# Altium schematic symbol library Schlib.SchLib: 725 symbols (part 1 of 6)
Pins are listed as number, name and electrical type; pins without a type are passive.

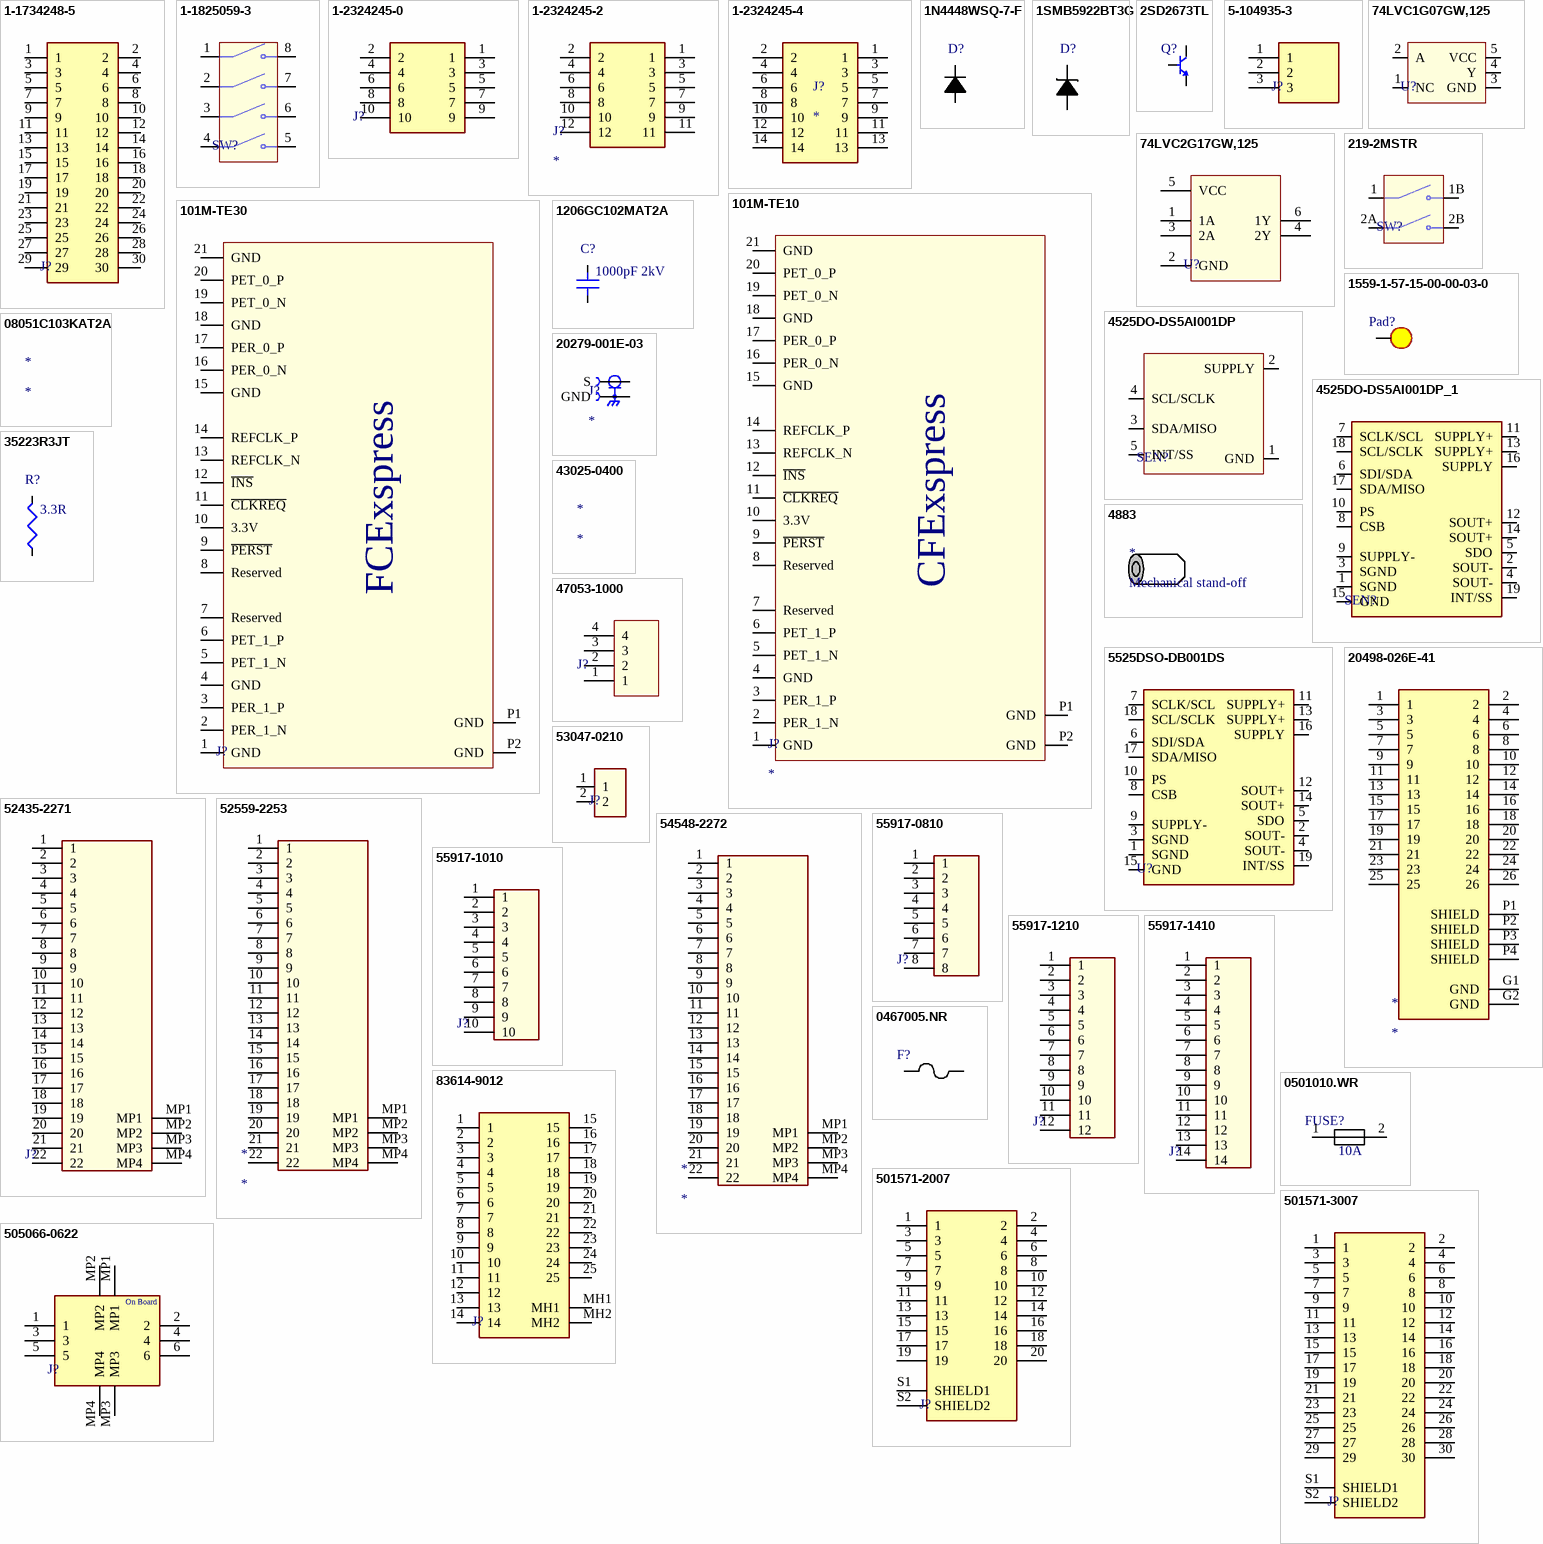
[diagram p0: symbols 1-1734248-5 to 505066-0622]

## 1-1734248-5
designator J?  (value not drawn)
FPC CONNECTOR, RECEPTACLE 15POS 1MMPITCH; Series:FPC; Gender:Receptacle; Pitch S; MP: 1-1734248-5; MF: TE Connectivity; EU_RoHS_Compliance: Compliant; TE_purchase_URL: https://www.te.com/usa-en/product-1-1734248-5.html?te_bu=Cor&te_type=disp&te_campaign=seda_glo_cor-seda-global-disp-prtnr-fy19-seda-model-bom-cta_sma-317_1&elqCampaignId=32493; SnapEDA_Link: https://www.snapeda.com/parts/1-1734248-5/TE%20Connectivity%20AMP%20Connectors/view-part/822357/?ref=snap; Package: None; Digi-Key_Purchase_URL: https://www.digikey.com/product-detail/en/te-connectivity-amp-connectors/1-1734248-5/A101418CT-ND/2567554?utm_source=snapeda&utm_medium=aggregator&utm_campaign=symbol; Digi-Key_Part_Number: A101418CT-ND; Value: *
footprint 1-1734248-5
pins: 1, 2, 3, 4, 5, 6, 7, 8, 9, 10, 11, 12, 13, 14, 15, 16, 17, 18, 19, 20, 21, 22, 23, 24, 25, 26, 27, 28, 29, 30

## 1-1825059-3
designator SW?  (value not drawn)
Switch DIP OFF ON SPST 4 Flush Slide 0.1A 24VDC Gull Wing 2.54mm SMD Tube; Manufacturer: TE Connectivity; Manufacturer Part Number: 1-1825059-3; Actuator Material: Polyamide; Body Material: Polyphenylene; Mechanical Life: 1000Cycles; Max Voltage Rating (DC): 24V; Number of Positions: 4; Contact Resistance: 50mR; Voltage Rating (DC): 5V; Max Current Rating: 100mA; Contact Current Rating: 1A; Sealable: No (Without); Actuator Type: Slide (Standard); Pitch: 0.1inch; Actuator Length: 0mm; Washable: Yes; Supplier: Future Electronics; Supplier Part Number: 2164646; RoHS: Yes; Category: DIP Switches; Stock: 11020; Pricing: 1=0.62, 50=0.6, 200=0.57, 500=0.555, 2000=0.51 (USD); Mounting Technology: Surface Mount; Contact Material: Copper Alloy; Contact Plating: Gold; Housing Color: Black; Housing Material: Polyphenylene; Min Operating Temperature: -30°C; Max Operating Temperature: 85°C; Throw Configuration: SPST; Termination: Gull Wing; Packaging: Rail/Tube; Package Quantity: 35; Electrical Life: 1000Cycles; Number of Circuits: 4; Orientation: Straight; Type: Switch; Series: ADF; Current Rating: 100mA; Length: 12.14mm; Height: 0.138inch; Terminal Pitch: 2.54mm; Depth: 9.3mm; Radiation Hardening: No; ELV: Compliant; Flammability Rating: UL94 V-0; RoHS Compliant: Yes; Reach SVHC Compliant: Unknown; Lead Free: 5697LeadFree
footprint 1-1825059-3
pins: 1, 2, 3, 4, 5, 6, 7, 8

## 1-2324245-0
designator J?  (value not drawn)
Board Connector, 10 Contact(s), 2 Row(s), Male, Straight, Solder Terminal, Natural Insulator; Manufacturer: TE Connectivity; Manufacturer Part Number: 1-2324245-0; Manufacturer Lifecycle Status: ACTIVE; Connector System: Wire-to-Board; Contact Current Rating: 4.2A; Contact Style: Pin; Dielectric Material: Polyamide; Mating Retention: Without; Number of Contacts: 10; Number of Ports: 1; Operating Supply Voltage: 250V; PCB Mount Alignment: With; Plating: Tin; Plating Thickness: 1.999996µm; Sealable: No; Supplier: DigiKey; Supplier Part Number: 17-1-2324245-0-ND; RoHS: Compliant; Category: Card Edge Connectors; Stock: 4822; Pricing: 1=1.09, 10=0.927, 100=0.7879, 500=0.70322, 1440=0.65263, 5760=0.59184, 10080=0.56895 (USD); China RoHS: Compliant; Contact Gender: Male; Contact Material: Brass; Contact Plating: Tin; Current Rating: 4.2A; Housing Color: Natural; Housing Material: Nylon; Length: 15.39mm; Lifecycle Status: Production; Max Operating Temperature: 105°C; Min Operating Temperature: -55°C; Pins: 10; Number of Positions: 10; Number of Rows: 2; Orientation: Vertical; Packaging: Box; PCB Mount Retention: With; REACH SVHC: Yes; Shielding: No; Terminal Pitch: 2.5mm; Width: 10.16mm; ComponentLink1URL: https://datasheet.octopart.com:443/1-2324245-0-TE-Connectivity-datasheet-179910410.pdf?src-supplier=IHS; ComponentLink1Description: https://datasheet.octopart.com:443/1-2324245-0-TE-Connectivity-datasheet-179910410.pdf?src-supplier=IHS; ComponentLink2URL: https://datasheet.octopart.com:443/1-2324245-0-TE-Connectivity-datasheet-179910411.pdf?src-supplier=IHS; ComponentLink2Description: https://datasheet.octopart.com:443/1-2324245-0-TE-Connectivity-datasheet-179910411.pdf?src-supplier=IHS; ComponentLink3URL: https://datasheet.octopart.com:443/1-2324245-0-TE-Connectivity-datasheet-136662082.pdf?src-supplier=Electro+Sonic; ComponentLink3Description: https://datasheet.octopart.com:443/1-2324245-0-TE-Connectivity-datasheet-136662082.pdf?src-supplier=Electro+Sonic; ComponentLink4URL: https://sigma.octopart.com:443/136536141/technical_drawing/TE-Connectivity-1-2324245-0.pdf?src-supplier=ShanghaiCT; ComponentLink4Description: https://sigma.octopart.com:443/136536141/technical_drawing/TE-Connectivity-1-2324245-0.pdf?src-supplier=ShanghaiCT
footprint 1-2324245-0
pins: 1, 2, 3, 4, 5, 6, 7, 8, 9, 10

## 1-2324245-2
designator J?
Board Connector, 12 Contact(s), 2 Row(s), Male, Straight, Solder Terminal, Natural Insulator; Manufacturer: TE Connectivity / AMP; Manufacturer Part Number: 1-2324245-2; Connector System: Wire-to-Board; Contact Current Rating: 4.2A; Contact Style: Pin; Dielectric Material: Polyamide; Mating Retention: Without; Number of Contacts: 12; Number of Ports: 1; Operating Supply Voltage: 250V; PCB Mount Alignment: With; Plating: Tin; Plating Thickness: 1.999996µm; Sealable: No; Supplier: DigiKey; Supplier Part Number: 17-1-2324245-2-ND; RoHS: Compliant; Category: Card Edge Connectors; Stock: 6151; Pricing: 1=1.27, 10=1.075, 100=0.9136, 500=0.81546, 1440=0.75681, 5760=0.68632, 10080=0.65978 (USD); China RoHS: Compliant; Contact Gender: Male; Contact Material: Brass; Contact Plating: Tin; Current Rating: 4.2A; Housing Color: Natural; Housing Material: Nylon; Length: 17.8816mm; Lifecycle Status: Production; Max Operating Temperature: 105°C; Min Operating Temperature: -55°C; Pins: 12; Number of Positions: 12; Number of Rows: 2; Orientation: Vertical; Packaging: Box; PCB Mount Retention: With; REACH SVHC: Yes; Shielding: No; Terminal Pitch: 2.5mm; Width: 10.16mm; ComponentLink1URL: https://datasheet.octopart.com:443/1-2324245-2-TE-Connectivity-datasheet-179910413.pdf?src-supplier=IHS; ComponentLink1Description: https://datasheet.octopart.com:443/1-2324245-2-TE-Connectivity-datasheet-179910413.pdf?src-supplier=IHS; ComponentLink2URL: https://datasheet.octopart.com:443/1-2324245-2-TE-Connectivity-datasheet-179910412.pdf?src-supplier=IHS; ComponentLink2Description: https://datasheet.octopart.com:443/1-2324245-2-TE-Connectivity-datasheet-179910412.pdf?src-supplier=IHS; ComponentLink3URL: https://datasheet.octopart.com:443/1-2324245-2-TE-Connectivity---AMP-datasheet-136662082.pdf?src-supplier=Sager+Electronics; ComponentLink3Description: https://datasheet.octopart.com:443/1-2324245-2-TE-Connectivity---AMP-datasheet-136662082.pdf?src-supplier=Sager+Electronics; ComponentLink4URL: https://sigma.octopart.com:443/136536141/technical_drawing/TE-Connectivity-1-2324245-2.pdf?src-supplier=ShanghaiCT; ComponentLink4Description: https://sigma.octopart.com:443/136536141/technical_drawing/TE-Connectivity-1-2324245-2.pdf?src-supplier=ShanghaiCT
footprint 1-2324245-2
pins: 1, 2, 3, 4, 5, 6, 7, 8, 9, 10, 11, 12

## 1-2324245-4
designator J?
Manufacturer: TE Connectivity AMP; Manufacturer Part Number: 1-2324245-4; Supplier 1: Mouser; RoHS: No; Pricing 1: 1=1.16, 10=0.984, 50=0.924, 100=0.884, 1000=0.723, 10000=0.617 (USD); Supplier Part Number 1: 571-1-2324245-4
footprint 1-2324245-4
pins: 1, 2, 3, 4, 5, 6, 7, 8, 9, 10, 11, 12, 13, 14

## 1N4448WSQ-7-F
designator D?  (value not drawn)
Rectifier Diode Small Signal Switching 75V 0.5A 4ns Automotive 2-Pin SOD-323 T/R; Manufacturer: Diodes; Manufacturer Part Number: 1N4448WSQ-7-F; Average Rectified Current: 250mA; Supplier: Digi-Key; Supplier Part Number: 1N4448WSQ-7-FDICT-ND; RoHS: Yes; Category: Rectifier Diodes; Stock: 112432; Pricing: 1=0.28000, 10=0.23300, 100=0.12330, 500=0.08112, 1000=0.05516 (USD); Mounting Technology: Surface Mount; Packaging: Tape and Reel; Reverse Recovery Time: 4ns; Max Reverse Voltage (DC): 75V; RoHS Compliant: Yes; ComponentLink1URL: http://www.mouser.com/ds/2/115/1N4448WSF-606710.pdf?src-supplier=Mouser; ComponentLink1Description: http://www.mouser.com/ds/2/115/1N4448WSF-606710.pdf?src-supplier=Mouser; ComponentLink2URL: https://www.diodes.com/assets/Datasheets/ds30096.pdf?src-supplier=Digi-Key; ComponentLink2Description: https://www.diodes.com/assets/Datasheets/ds30096.pdf?src-supplier=Digi-Key
footprint SC-76, SOD-323
pins: 1 C, 2 A

## 1SMB5922BT3G
designator D?  (value not drawn)
Zener Diode Single 7.5V 5% 3Ohm 3000mW Automotive 2-Pin SMB T/R / DIODE ZENER 7.5V 3W SMB; Manufacturer: onsemi; Manufacturer Part Number: 1SMB5922BT3G; Manufacturer Lifecycle Status: ACTIVE; Breakdown Voltage: 7.88V; Forward Voltage: 1.5V; Impedance: 3Ω; Material: Plastic; Max Power Dissipation: 550mW; Max Reverse Leakage Current: 5µA; Number of Elements: 1; Polarity: Unidirectional; Test Current: 50mA; Supplier: Future Electronics; Supplier Part Number: 2745859; RoHS: Compliant; Category: Zener Diodes; Stock: 67500; Pricing: 2500=0.122, 5000=0.12, 7500=0.119, 12500=0.117 (USD); Case/Package: SMB; China RoHS: Non-Compliant; Element Configuration: Single; Halogen Free: Halogen Free; Height: 2.28mm; Lead Free: Lead Free; Length: 4.6mm; Lifecycle Status: Production; Max Operating Temperature: 150°C; Min Operating Temperature: -65°C; Mounting Technology: Surface Mount; Pins: 2; Number of Terminals: 2; Packaging: Tape and Reel; Peak Reverse Current: 5µA; Power Dissipation: 550mW; Power Rating: 3W; Radiation Hardening: No; REACH SVHC: No; Reference Voltage: 7.5V; Schedule B: 8541100050; Tolerance: 5%; Voltage Rating (DC): 7.5V; Voltage Tolerance: 5%; Width: 3.95mm; Working Voltage: 7.5V; Zener Current: 50mA; Zener Voltage: 7.5V; ComponentLink1URL: https://datasheet.octopart.com:443/1SMB5922BT3G-ON-Semiconductor-datasheet-10678159.pdf?src-supplier=Newark; ComponentLink1Description: https://datasheet.octopart.com:443/1SMB5922BT3G-ON-Semiconductor-datasheet-10678159.pdf?src-supplier=Newark; ComponentLink2URL: https://datasheet.octopart.com:443/1SMB5922BT3G-ON-Semiconductor-datasheet-153452.pdf?src-supplier=Newark; ComponentLink2Description: https://datasheet.octopart.com:443/1SMB5922BT3G-ON-Semiconductor-datasheet-153452.pdf?src-supplier=Newark; ComponentLink3URL: https://datasheet.octopart.com:443/1SMB5922BT3G-ON-Semiconductor-datasheet-10412137.pdf?src-supplier=Newark; ComponentLink3Description: https://datasheet.octopart.com:443/1SMB5922BT3G-ON-Semiconductor-datasheet-10412137.pdf?src-supplier=Newark; ComponentLink4URL: https://datasheet.octopart.com:443/1SMB5922BT3G-ON-Semiconductor-datasheet-67293418.pdf?src-supplier=Newark; ComponentLink4Description: https://datasheet.octopart.com:443/1SMB5922BT3G-ON-Semiconductor-datasheet-67293418.pdf?src-supplier=Newark; ComponentLink5URL: https://datasheet.octopart.com:443/1SMB5922BT3G-onsemi-datasheet-180957219.pdf?src-supplier=IHS; ComponentLink5Description: https://datasheet.octopart.com:443/1SMB5922BT3G-onsemi-datasheet-180957219.pdf?src-supplier=IHS; ComponentLink6URL: https://datasheet.octopart.com:443/1SMB5922BT3G-onsemi-datasheet-188912624.pdf?src-supplier=TME; ComponentLink6Description: https://datasheet.octopart.com:443/1SMB5922BT3G-onsemi-datasheet-188912624.pdf?src-supplier=TME; ComponentLink7URL: https://datasheet.octopart.com:443/1SMB5922BT3G-onsemi-datasheet-189864032.pdf?src-supplier=Master+Electronics; ComponentLink7Description: https://datasheet.octopart.com:443/1SMB5922BT3G-onsemi-datasheet-189864032.pdf?src-supplier=Master+Electronics; ComponentLink8URL: https://datasheet.octopart.com:443/1SMB5922BT3G-ON-Semiconductor-datasheet-14050955.pdf?src-supplier=iiiC; ComponentLink8Description: https://datasheet.octopart.com:443/1SMB5922BT3G-ON-Semiconductor-datasheet-14050955.pdf?src-supplier=iiiC; ComponentLink9URL: https://datasheet.octopart.com:443/1SMB5922BT3G-ON-Semiconductor-datasheet-9561972.pdf?src-supplier=RS+(Formerly+Allied+Electronics); ComponentLink9Description: https://datasheet.octopart.com:443/1SMB5922BT3G-ON-Semiconductor-datasheet-9561972.pdf?src-supplier=RS+(Formerly+Allied+Electronics); ComponentLink10URL: https://datasheet.octopart.com:443/1SMB5922BT3G-ON-Semiconductor-datasheet-7627526.pdf?src-supplier=Farnell; ComponentLink10Description: https://datasheet.octopart.com:443/1SMB5922BT3G-ON-Semiconductor-datasheet-7627526.pdf?src-supplier=Farnell; ComponentLink11URL: http://sigma.octopart.com:80/15540786/rohs_certificate/ON-Semiconductor-1SMB5922BT3G.pdf?src-supplier=Compliance+Statements; ComponentLink11Description: http://sigma.octopart.com:80/15540786/rohs_certificate/ON-Semiconductor-1SMB5922BT3G.pdf?src-supplier=Compliance+Statements; ComponentLink12URL: http://sigma.octopart.com:80/15673265/materials_sheet/ON-Semiconductor-1SMB5922BT3G.csv?src-supplier=Compliance+Statements; ComponentLink12Description: http://sigma.octopart.com:80/15673265/materials_sheet/ON-Semiconductor-1SMB5922BT3G.csv?src-supplier=Compliance+Statements; ComponentLink13URL: http://sigma.octopart.com:80/150599696/rohs_statement/ON-Semiconductor-1SMB5922BT3G.pdf?src-supplier=Compliance+Statements; ComponentLink13Description: http://sigma.octopart.com:80/150599696/rohs_statement/ON-Semiconductor-1SMB5922BT3G.pdf?src-supplier=Compliance+Statements; ComponentLink14URL: http://sigma.octopart.com:80/reach_statement/ON-Semiconductor-company-79.pdf?src-supplier=Compliance+Statements; ComponentLink14Description: http://sigma.octopart.com:80/reach_statement/ON-Semiconductor-company-79.pdf?src-supplier=Compliance+Statements; ComponentLink15URL: https://octopart.com:443/opatz8j6/c1?t=-7Rg5-dSOU17S9jwLgJaavQGNUK9I1EhJcmL9O0uj0MAmvVYjunI46o06CYUqwLsnTuZJspTSg8-XwmEUtJEwnxSUGjx9aoqj4zPIYIcezFGTC7sXXgO-3Xuah-Wupz6Xwk_Pk9Iz_qMgvxKBFd9CBDUs-wWmsDvgPLrEWXJydIv3Ndk7mJtZGppQRaSRE83wVcjcEf3Mtwz2hYf1pKoff-5cvyHiRKQZbTd2pGjMVKMsmql2P0_vAYkmP_Enr17p01wrcW36guBQHgV71z0O3t4ZwkjxooQqRImpCkT62eGixJE513f7NLjaDwmb4xkSeGRzr_CYUJT6e777a2dUGKES0C5LFNNnPTvFrWs&src-supplier=Compliance+Statements; ComponentLink15Description: https://octopart.com:443/opatz8j6/c1?t=-7Rg5-dSOU17S9jwLgJaavQGNUK9I1EhJcmL9O0uj0MAmvVYjunI46o06CYUqwLsnTuZJspTSg8-XwmEUtJEwnxSUGjx9aoqj4zPIYIcezFGTC7sXXgO-3Xuah-Wupz6Xwk_Pk9Iz_qMgvxKBFd9CBDUs-wWmsDvgPLrEWXJydIv3Ndk7mJtZGppQRaSRE83wVcjcEf3Mtwz2hYf1pKoff-5cvyHiRKQZbTd2pGjMVKMsmql2P0_vAYkmP_Enr17p01wrcW36guBQHgV71z0O3t4ZwkjxooQqRImpCkT62eGixJE513f7NLjaDwmb4xkSeGRzr_CYUJT6e777a2dUGKES0C5LFNNnPTvFrWs&src-supplier=Compliance+Statements; ComponentLink16URL: https://octopart.com:443/opatz8j6/c1?t=NgEzYUtCDJ1w5-5WDxpkIolHOKxYmBgDgk-9cXA7jIA6s3Xk8fSO9zTHMsU2ucfknkyd0g8yK1u_XLrEUQPKRB3unLoM0tUfBPnKIOq9VLpIKVf_U5C7HQk7b9f9pw0ozZqgNezt-ul_dFuacCARCxN895LxkLa4wbit1BVLXj1fhcqP5HuG5PJsD6MHDp_ris7Bp_ACvKCavLZ8j5PJTVazboxl6G4nD9_Li_rOJfneY0TTDQZa7OdjLNlnkuML4yjssLJrVdZ06UZcmqArRYxRs9qObHVQGKUZC99UGEe7SPRA8zOzH6KruEqYCxczlBDkjn6t_4W0hA_6qC9jEROtj5GEUkvm_LByjYk&src-supplier=Compliance+Statements; ComponentLink16Description: https://octopart.com:443/opatz8j6/c1?t=NgEzYUtCDJ1w5-5WDxpkIolHOKxYmBgDgk-9cXA7jIA6s3Xk8fSO9zTHMsU2ucfknkyd0g8yK1u_XLrEUQPKRB3unLoM0tUfBPnKIOq9VLpIKVf_U5C7HQk7b9f9pw0ozZqgNezt-ul_dFuacCARCxN895LxkLa4wbit1BVLXj1fhcqP5HuG5PJsD6MHDp_ris7Bp_ACvKCavLZ8j5PJTVazboxl6G4nD9_Li_rOJfneY0TTDQZa7OdjLNlnkuML4yjssLJrVdZ06UZcmqArRYxRs9qObHVQGKUZC99UGEe7SPRA8zOzH6KruEqYCxczlBDkjn6t_4W0hA_6qC9jEROtj5GEUkvm_LByjYk&src-supplier=Compliance+Statements
footprint DO-214AA_SMB
pins: 1 C, 2 A

## 2SD2673TL
designator Q?  (value not drawn)
Trans Gp Bjt NPN 30V 3A 1000MW 3-PIN Tsmt T/r; Manufacturer: Rohm; Manufacturer Part Number: 2SD2673TL; Max Power Dissipation: 1W; hFE Min: 270; Frequency: 200MHz; Emitter Base Voltage (VEBO): 6V; Collector Emitter Saturation Voltage: 120mV; Number of Elements: 1; Element Configuration: Single; Collector-emitter Voltage-Max: 250mV; Supplier: Digi-Key; Supplier Part Number: 2SD2673TLCT-ND; RoHS: Yes; Category: BJTs; Stock: 1439; Pricing: 1=0.72000, 10=0.63300, 100=0.48540, 500=0.38372, 1000=0.30698 (USD); Mounting Technology: Surface Mount; Case/Package: SOT-346T; Pins: 3; Contact Plating: Copper,Tin,Silver; Min Operating Temperature: -55°C; Max Operating Temperature: 150°C; Packaging: Tape and Reel; Package Quantity: 1; Collector Emitter Voltage (VCEO): 30V; Max Collector Current: 3A; Transition Frequency: 200MHz; Collector Emitter Breakdown Voltage: 30V; Max Breakdown Voltage: 30V; Polarity: NPN; Collector Base Voltage (VCBO): 30V; Power Dissipation: 1W; Gain Bandwidth Product: 200MHz; Voltage Rating (DC): 30V; Current Rating: 3A; Series: -; Radiation Hardening: No; Lead Free: Lead Free; RoHS Compliant: Yes; ComponentLink1URL: https://datasheet.ciiva.com/11203/2sd2673-11203489.pdf?src-supplier=Avnet; ComponentLink1Description: https://datasheet.ciiva.com/11203/2sd2673-11203489.pdf?src-supplier=Avnet; ComponentLink2URL: https://datasheet.ciiva.com/26878/getdatasheetpartid-457694-26878623.pdf?src-supplier=Verical; ComponentLink2Description: https://datasheet.ciiva.com/26878/getdatasheetpartid-457694-26878623.pdf?src-supplier=Verical; ComponentLink3URL: https://datasheet.ciiva.com/975/2sd2673-975303.pdf?src-supplier=Digi-Key; ComponentLink3Description: https://datasheet.ciiva.com/975/2sd2673-975303.pdf?src-supplier=Digi-Key; ComponentLink4URL: https://datasheet.ciiva.com/16289/2sd2673-209105-16289342.pdf?src-supplier=Mouser; ComponentLink4Description: https://datasheet.ciiva.com/16289/2sd2673-209105-16289342.pdf?src-supplier=Mouser; ComponentLink5URL: https://datasheet.ciiva.com/975/2sd2673-975304.pdf?src-supplier=Digi-Key; ComponentLink5Description: https://datasheet.ciiva.com/975/2sd2673-975304.pdf?src-supplier=Digi-Key; ComponentLink6URL: https://datasheet.ciiva.com/975/2sd2673-975305.pdf?src-supplier=Digi-Key; ComponentLink6Description: https://datasheet.ciiva.com/975/2sd2673-975305.pdf?src-supplier=Digi-Key
footprint SOT-346
pins: 1 B, 2 E, 3 C

## 5-104935-3
designator J?  (value not drawn)
Connector, Header, 3Pos, 1Rows, 2.54Mm Rohs Compliant: Yes |Amp Te Connectivity 5-104935-3; Manufacturer Lifecycle Status: ACTIVE; Approvals: CSA; Connector Type: Header, Pin, Plug; Contact Current Rating: 3A; Contact Resistance: 15mΩ; Contact Style: Pin; Dielectric Material: Polyethylene; Gender: Male; Insulation Resistance: 5GΩ; Mating Post Length: 5.842mm; Mating Retention: With; Max Voltage Rating (AC): 30V; Number of Contacts: 3; Number of Ports: 1; Operating Force: 2.502N; PCB Mount Alignment: Without; PCB Mounting Orientation: Right Angle; PCB Thickness: 1.5748mm; Plating: Gold; Plating Thickness: 762nm; Shielding: No; Tail Length: 3.3mm; Supplier: Farnell; Supplier Part Number: 3398527; Manufacturer: TE Connectivity; Manufacturer Part Number: 5-104935-3; RoHS: Compliant; Category: Headers and Wire Housings; Stock: 3660; Pricing: 1=1.28, 10=1.03, 100=0.772, 500=0.716, 1000=0.683, 2500=0.669 (EUR); China RoHS: Compliant; Color: Black; Contact Finish Thickness - Mating: 762nm; Contact Gender: Male; Contact Material: Brass; Contact Mating Length: 5.842mm; Contact Plating: Gold, Tin; Contact Shape: Square; Current Rating: 3A; Depth: 13.59mm; ELV: Compliant; Flammability Rating: UL94 V-0; Height: 6.98mm; Housing Color: Black; Housing Material: Thermoplastic; Lead Free: Lead Free; Length: 10.16mm; Lifecycle Status: Production; Max Operating Temperature: 105°C; Min Operating Temperature: -65°C; Mounting Technology: Through Hole; Pins: 3; Number of Positions: 3; Number of Rows: 1; Orientation: Right Angle; PCB Mount Retention: Without; Pitch: 2.54mm; Radiation Hardening: No; REACH SVHC: Yes; Row Spacing: 2.54mm; Terminal Pitch: 2.54mm; Termination: Crimp; ComponentLink1URL: https://datasheet.octopart.com:443/5-104935-3-TE-Connectivity-datasheet-180094949.pdf?src-supplier=IHS; ComponentLink1Description: https://datasheet.octopart.com:443/5-104935-3-TE-Connectivity-datasheet-180094949.pdf?src-supplier=IHS; ComponentLink2URL: https://datasheet.octopart.com:443/5-104935-3-TE-Connectivity-datasheet-147328941.pdf?src-supplier=Upverter; ComponentLink2Description: https://datasheet.octopart.com:443/5-104935-3-TE-Connectivity-datasheet-147328941.pdf?src-supplier=Upverter; ComponentLink3URL: https://datasheet.octopart.com:443/5-104935-3-TE-Connectivity-datasheet-11077636.pdf?src-supplier=Farnell; ComponentLink3Description: https://datasheet.octopart.com:443/5-104935-3-TE-Connectivity-datasheet-11077636.pdf?src-supplier=Farnell; ComponentLink4URL: https://datasheet.octopart.com:443/5-104935-3-TE-Connectivity-datasheet-136861139.pdf?src-supplier=JRH+Electronics; ComponentLink4Description: https://datasheet.octopart.com:443/5-104935-3-TE-Connectivity-datasheet-136861139.pdf?src-supplier=JRH+Electronics; ComponentLink5URL: https://datasheet.octopart.com:443/5-104935-3-TE-Connectivity-datasheet-8324834.pdf?src-supplier=Electro+Sonic; ComponentLink5Description: https://datasheet.octopart.com:443/5-104935-3-TE-Connectivity-datasheet-8324834.pdf?src-supplier=Electro+Sonic; ComponentLink6URL: https://sigma.octopart.com:443/81842454/technical_drawing/TE-Connectivity-5-104935-3.pdf?src-supplier=Future+Electronics; ComponentLink6Description: https://sigma.octopart.com:443/81842454/technical_drawing/TE-Connectivity-5-104935-3.pdf?src-supplier=Future+Electronics; ComponentLink7URL: https://sigma.octopart.com:443/15110274/technical_drawing/TE-Connectivity-5-104935-3.pdf?src-supplier=Factory+Futures; ComponentLink7Description: https://sigma.octopart.com:443/15110274/technical_drawing/TE-Connectivity-5-104935-3.pdf?src-supplier=Factory+Futures; ComponentLink8URL: https://datasheet.octopart.com:443/5-104935-3-Agastat-datasheet-13560061.pdf?src-supplier=TE+Connectivity; ComponentLink8Description: https://datasheet.octopart.com:443/5-104935-3-Agastat-datasheet-13560061.pdf?src-supplier=TE+Connectivity; ComponentLink9URL: https://datasheet.octopart.com:443/5-104935-3-TE-Connectivity-datasheet-169146842.pdf?src-supplier=Sager+Electronics; ComponentLink9Description: https://datasheet.octopart.com:443/5-104935-3-TE-Connectivity-datasheet-169146842.pdf?src-supplier=Sager+Electronics; ComponentLink10URL: https://datasheet.octopart.com:443/5-104935-3-TE-Connectivity-datasheet-177759475.pdf?src-supplier=Burklin+Elektronik; ComponentLink10Description: https://datasheet.octopart.com:443/5-104935-3-TE-Connectivity-datasheet-177759475.pdf?src-supplier=Burklin+Elektronik; ComponentLink11URL: https://datasheet.octopart.com:443/5-104935-3-TE-Connectivity---AMP-datasheet-189108356.pdf?src-supplier=Master+Electronics; ComponentLink11Description: https://datasheet.octopart.com:443/5-104935-3-TE-Connectivity---AMP-datasheet-189108356.pdf?src-supplier=Master+Electronics; ComponentLink12URL: https://datasheet.octopart.com:443/5-104935-3-TE-Connectivity-datasheet-8218714.pdf?src-supplier=Jameco; ComponentLink12Description: https://datasheet.octopart.com:443/5-104935-3-TE-Connectivity-datasheet-8218714.pdf?src-supplier=Jameco; ComponentLink13URL: http://sigma.octopart.com:80/62303947/materials_sheet/TE-Connectivity-5-104935-3.pdf?src-supplier=Compliance+Statements; ComponentLink13Description: http://sigma.octopart.com:80/62303947/materials_sheet/TE-Connectivity-5-104935-3.pdf?src-supplier=Compliance+Statements; ComponentLink14URL: http://sigma.octopart.com:80/15110280/rohs_certificate/Agastat-5-104935-3.pdf?src-supplier=Compliance+Statements; ComponentLink14Description: http://sigma.octopart.com:80/15110280/rohs_certificate/Agastat-5-104935-3.pdf?src-supplier=Compliance+Statements
footprint 5-104935-3
pins: 1, 2, 3

## 74LVC1G07GW,125
designator U?  (value not drawn)
Buffer, Non-Inverting 1 Element 1 Bit per Element Open Drain Output 5-TSSOP; Manufacturer: Nexperia; Manufacturer Part Number: 74LVC1G07GW,125; Supplier: Future Electronics; Supplier Part Number: 9055534; RoHS: Yes; Category: Logic Gates; Stock: 66000; Pricing: 3000=0.0273, 9000=0.0263, 15000=0.0259, 45000=0.0249, 75000=0.0241 (USD); ComponentLink1URL: http://www.farnell.com/datasheets/2185287.pdf?src-supplier=Farnell; ComponentLink1Description: http://www.farnell.com/datasheets/2185287.pdf?src-supplier=Farnell; ComponentLink2URL: https://assets.nexperia.com/documents/data-sheet/74LVC1G07.pdf?src-supplier=Digi-Key; ComponentLink2Description: https://assets.nexperia.com/documents/data-sheet/74LVC1G07.pdf?src-supplier=Digi-Key; ComponentLink3URL: https://datasheet.octopart.com/74LVC1G07GW%2C125-Nexperia-datasheet-11798985.pdf?src-supplier=Element14; ComponentLink3Description: https://datasheet.octopart.com/74LVC1G07GW%2C125-Nexperia-datasheet-11798985.pdf?src-supplier=Element14; ComponentLink4URL: http://www.farnell.com/datasheets/2185287.pdf?src-supplier=Newark; ComponentLink4Description: http://www.farnell.com/datasheets/2185287.pdf?src-supplier=Newark; ComponentLink5URL: https://datasheet.octopart.com/74LVC1G07GW%2C125-Nexperia-datasheet-8826326.pdf?src-supplier=Future+Electronics; ComponentLink5Description: https://datasheet.octopart.com/74LVC1G07GW%2C125-Nexperia-datasheet-8826326.pdf?src-supplier=Future+Electronics; ComponentLink6URL: https://datasheet.octopart.com/74LVC1G07GW%2C125-Nexperia-datasheet-78862075.pdf?src-supplier=Newark; ComponentLink6Description: https://datasheet.octopart.com/74LVC1G07GW%2C125-Nexperia-datasheet-78862075.pdf?src-supplier=Newark; ComponentLink7URL: https://datasheet.octopart.com/74LVC1G07GW%2C125-Nexperia-datasheet-159007449.pdf?src-supplier=SHENGYU+ELECTRONICS; ComponentLink7Description: https://datasheet.octopart.com/74LVC1G07GW%2C125-Nexperia-datasheet-159007449.pdf?src-supplier=SHENGYU+ELECTRONICS
footprint 74LVC1G07GW,125
pins: 1 NC, 2 A, 3 GND, 4 Y, 5 VCC

## 74LVC2G17GW,125
designator U?  (value not drawn)
IC SCHMT TRIG BUFF/DVR DL 6TSSOP; Manufacturer: Nexperia; Manufacturer Part Number: 74LVC2G17GW,125; Supplier 1: Digi-Key; RoHS: Yes; Category: Logic Gates; Stock 1: 97610; Pricing 1: 1=0.46000, 10=0.34600, 25=0.30280, 100=0.19590, 250=0.16216, 500=0.12974, 1000=0.09947 (USD); RoHS Compliant: Yes; ComponentLink1URL: http://www.farnell.com/datasheets/2242061.pdf?src-supplier=Farnell; ComponentLink1Description: http://www.farnell.com/datasheets/2242061.pdf?src-supplier=Farnell; ComponentLink2URL: http://www.farnell.com/datasheets/78656.pdf?src-supplier=Farnell; ComponentLink2Description: http://www.farnell.com/datasheets/78656.pdf?src-supplier=Farnell; ComponentLink3URL: https://assets.nexperia.com/documents/data-sheet/74LVC2G17.pdf?src-supplier=Digi-Key; ComponentLink3Description: https://assets.nexperia.com/documents/data-sheet/74LVC2G17.pdf?src-supplier=Digi-Key; Supplier Part Number 1: 1727-4218-6-ND
footprint SOT-363
pins: 1 1A, 2 GND, 3 2A, 4 2Y, 5 VCC, 6 1Y

## 101M-TE10
designator J?
Conn Cfexpress Card R/a SMD; Manufacturer: Attend; Manufacturer Part Number: 101M-TE10; Supplier: Digikey; Supplier Part Number: 4827-101M-TE10-ND; RoHS: No; Category: LDO; Stock: 618; Pricing: 1=5.89, 10=5.006, 25=4.6924, 40=4.53925, 80=4.32238, 350=3.89494, 700=3.70917, 1050=3.60465, 2450=3.39573 (USD)
footprint 101M-TE10
pins: 1 GND, 2 PER_1_N, 3 PER_1_P, 4 GND, 5 PET_1_N, 6 PET_1_P, 7 Reserved, 8 Reserved, 9 ~{PERST}, 10 3.3V, 11 ~{CLKREQ}, 12 ~{INS}, 13 REFCLK_N, 14 REFCLK_P, 15 GND, 16 PER_0_N, 17 PER_0_P, 18 GND, 19 PET_0_N, 20 PET_0_P, 21 GND, P1 GND, P2 GND
text: CFExspress

## 101M-TE30
designator J?  (value not drawn)
Conn Cfexpress Card R/a SMD; Manufacturer: Attend; Manufacturer Part Number: 101M-TE30; Supplier: Digikey; Supplier Part Number: 4827-101M-TE30-ND; RoHS: No; Category: LDO; Stock: 387; Pricing: 1=7.52, 10=5.765, 25=5.2032, 40=4.941, 80=4.58438, 350=3.93169, 700=3.66949, 1050=3.5278, 2450=3.2875 (USD)
footprint 101M-TE30
pins: 1 GND, 2 PER_1_N, 3 PER_1_P, 4 GND, 5 PET_1_N, 6 PET_1_P, 7 Reserved, 8 Reserved, 9 ~{PERST}, 10 3.3V, 11 ~{CLKREQ}, 12 ~{INS}, 13 REFCLK_N, 14 REFCLK_P, 15 GND, 16 PER_0_N, 17 PER_0_P, 18 GND, 19 PET_0_N, 20 PET_0_P, 21 GND, P1 GND, P2 GND
text: FCExspress

## 219-2MSTR
designator SW?  (value not drawn)
Switch DIP ON OFF SPST 2 Raised Slide 0.1A 20VDC Gull Wing 2000Cycles 2.54mm SMD T/R; Manufacturer: CTS; Manufacturer Part Number: 219-2MSTR; Contact Current Rating: 100mA; Contact Resistance: 25mR; Number of Circuits: 2NUMBER; Supplier: Future Electronics; Supplier Part Number: 8096207; RoHS: Yes; Category: DIP Switches; Stock: 396; Pricing: 1=0.845, 10=0.745, 40=0.685, 150=0.63, 500=0.575 (USD); Lead Free: 5697LeadFree; ComponentLink1URL: https://datasheet.ciiva.com/8679/219-8679450.pdf?src-supplier=Avnet; ComponentLink1Description: https://datasheet.ciiva.com/8679/219-8679450.pdf?src-supplier=Avnet; ComponentLink2URL: https://datasheet.ciiva.com/15210/getdatasheetpartid-92384-15210150.pdf?src-supplier=Verical; ComponentLink2Description: https://datasheet.ciiva.com/15210/getdatasheetpartid-92384-15210150.pdf?src-supplier=Verical; ComponentLink3URL: https://datasheet.ciiva.com/16316/219-16316219.pdf?src-supplier=Future+Electronics; ComponentLink3Description: https://datasheet.ciiva.com/16316/219-16316219.pdf?src-supplier=Future+Electronics
footprint 219-2MSTR
pins: 1 COM1, 1B NO1, 2A COM2, 2B NO2

## 1206GC102MAT2A
designator C?  value 1000pF 2kV  (hidden comment: *)
1206 2KV 1000pF X7R 20% multilayer ceramic capacitor; Manufacturer: Kyocera AVX; Manufacturer Part Number: 1206GC102MAT2A; Supplier: Digi-Key; Supplier Part Number: 478-1206GC102MAT2ACT-ND; RoHS: Yes; Category: Ceramic Capacitors; Stock: 3270; Pricing: 1=0.18000, 10=0.12100, 50=0.07280, 100=0.06140, 500=0.04202, 1000=0.03717 (USD); Case/Package: 1206; Packaging: Tape and Reel; Dielectric: X7R; Voltage Rating (DC): 2kV; Tolerance: 20%; RoHS Compliant: Yes; ComponentLink1URL: http://www.mouser.com/ds/2/40/X7RDielectric-777024.pdf?src-supplier=Mouser; ComponentLink1Description: http://www.mouser.com/ds/2/40/X7RDielectric-777024.pdf?src-supplier=Mouser
footprint C 1206
pins: 1 B, 2 A

## 1559-1-57-15-00-00-03-0
designator Pad?  (value not drawn)
Circuit Board Hardware - PCB .059 Diameter Target Disc; Manufacturer: Mill-Max; Manufacturer Part Number: 1559-1-57-15-00-00-03-0; Supplier: Mouser; Supplier Part Number: 575-1559157150000030; RoHS: No; Category: Connectors; Stock: 21776; Pricing: 1=0.47, 10=0.317, 50=0.317, 100=0.261, 1000=0.218, 10000=0.179 (USD); ComponentLink1URL: https://www.mill-max.com/products/pin/1559-1-57-15-00-00-03-0?src-supplier=Digi-Key; ComponentLink1Description: https://www.mill-max.com/products/pin/1559-1-57-15-00-00-03-0?src-supplier=Digi-Key; ComponentLink2URL: https://datasheet.octopart.com/1559-1-57-15-00-00-03-0-Mill-Max-datasheet-155664163.pdf?src-supplier=Sager+Electronics; ComponentLink2Description: https://datasheet.octopart.com/1559-1-57-15-00-00-03-0-Mill-Max-datasheet-155664163.pdf?src-supplier=Sager+Electronics
footprint 1559-1-57-15-00-00-03-0 (TestPoint)
pins: 1

## 4525DO-DS5AI001DP
designator SEN?  (value not drawn)
MS4515DO Series 1 PSI (6.89 kPa) ±0.25% PCB Mounted Digital Output Transducer; Manufacturer: TE Connectivity; Manufacturer Part Number: 4525DO-DS5AI001DP; Output Type: I2C; Pressure Type: Differential; Operating Pressure: 1PSI; Port Style: Barbed; Max Pressure: 10PSI; Supplier: Rs; Supplier Part Number: 1468201; RoHS: Yes; Category: Pressure Sensors; Stock: 52; Pricing: 10=37.12 (GBP); Min Operating Temperature: -25°C; Max Operating Temperature: 105°C; Series: MS4525DO; Accuracy: 0.25%; Termination: PC Pin; Lead Free: Lead Free; RoHS Compliant: Yes; ComponentLink1URL: https://www.te.com/commerce/DocumentDelivery/DDEController?Action=srchrtrv&DocNm=MS4525DO&DocType=DS&DocLang=English&src-supplier=Digi-Key; ComponentLink1Description: https://www.te.com/commerce/DocumentDelivery/DDEController?Action=srchrtrv&DocNm=MS4525DO&DocType=DS&DocLang=English&src-supplier=Digi-Key
footprint 4525DO-DS5AI001DP
pins: 1 GND, 2 SUPPLY, 3 SDA/MISO, 4 SCL/SCLK, 5 INT/SS

## 4525DO-DS5AI001DP_1
designator SEN?  (value not drawn)
MS4515DO Series 1 PSI (6.89 kPa) ±0.25% PCB Mounted Digital Output Transducer; Manufacturer: TE Connectivity; Manufacturer Part Number: 4525DO-DS5AI001DP; Output Type: I2C; Pressure Type: Differential; Operating Pressure: 1PSI; Port Style: Barbed; Max Pressure: 10PSI; Supplier: Rs; Supplier Part Number: 1468201; RoHS: Yes; Category: Pressure Sensors; Stock: 52; Pricing: 10=37.12 (GBP); Min Operating Temperature: -25°C; Max Operating Temperature: 105°C; Series: MS4525DO; Accuracy: 0.25%; Termination: PC Pin; Lead Free: Lead Free; RoHS Compliant: Yes; ComponentLink1URL: https://www.te.com/commerce/DocumentDelivery/DDEController?Action=srchrtrv&DocNm=MS4525DO&DocType=DS&DocLang=English&src-supplier=Digi-Key; ComponentLink1Description: https://www.te.com/commerce/DocumentDelivery/DDEController?Action=srchrtrv&DocNm=MS4525DO&DocType=DS&DocLang=English&src-supplier=Digi-Key
footprint 4525DSO-DS5AI001DP_2
pins: 1 SGND, 2 SOUT-, 3 SGND, 4 SOUT-, 5 SDO, 6 SDI/SDA, 7 SCLK/SCL, 8 CSB, 9 SUPPLY-, 10 PS, 11 SUPPLY+, 12 SOUT+, 13 SUPPLY+, 14 SOUT+, 15 GND, 16 SUPPLY, 17 SDA/MISO, 18 SCL/SCLK, 19 INT/SS

## 4883
designator *, comment Mechanical stand-off
Standoff Round Swage F/F 4-40-THD Steel Electro-Tin; Manufacturer: Keystone Electronics; Manufacturer Part Number: 4883; Supplier: Digi-Key; Supplier Part Number: 36-4883CT-ND; RoHS: No; Category: Spacers, Standoffs; Stock: 55711; Pricing: 1=0.58, 25=0.5268, 100=0.3976, 250=0.3806 (USD); ComponentLink1URL: http://www.keyelco.com/product-pdf.cfm?p=14255&src-supplier=Digi-Key; ComponentLink1Description: http://www.keyelco.com/product-pdf.cfm?p=14255&src-supplier=Digi-Key; ComponentLink2URL: https://datasheet.octopart.com/4883-Keystone-datasheet-68560313.pdf?src-supplier=Newark; ComponentLink2Description: https://datasheet.octopart.com/4883-Keystone-datasheet-68560313.pdf?src-supplier=Newark; ComponentLink3URL: https://datasheet.octopart.com/4883-Keystone-datasheet-100434986.pdf?src-supplier=Sager+Electronics; ComponentLink3Description: https://datasheet.octopart.com/4883-Keystone-datasheet-100434986.pdf?src-supplier=Sager+Electronics; ComponentLink4URL: https://datasheet.octopart.com/4883-Keystone-datasheet-159768380.pdf?src-supplier=TME; ComponentLink4Description: https://datasheet.octopart.com/4883-Keystone-datasheet-159768380.pdf?src-supplier=TME

## 5525DSO-DB001DS
designator U?  (value not drawn)
Sensor, Press Xdcr, Digital, D Barb, Diff, Pressure, 5525DSO-DB001DS; Manufacturer: TE Connectivity; Manufacturer Lifecycle Status: ACTIVE; Accuracy: 0.25%; Supplier: Farnell; Supplier Part Number: 3397819; Manufacturer Part Number: 5525DSO-DB001DS; RoHS: Compliant; Category: Pressure Sensors; Stock: 404; Pricing: 1=21.17, 5=20.17, 10=19.56, 25=17.9, 50=17.54 (GBP); China RoHS: Compliant; Height: 7.9mm; Lead Free: Lead Free; Length: 12.5mm; Lifecycle Status: Production; Max Operating Temperature: 125°C; Min Operating Temperature: -40°C; Mounting Technology: Surface Mount; REACH SVHC: No; Schedule B: 9026200000, 9026200000|9026200000|9026200000|9026200000|9026200000|9026200000|9026200000|9026200000|9026200000|9026200000|9026200000|9026200000|9026200000|9026200000|9026200000|9026200000|9026200000|9026200000|9026200000|9026200000|9026200000|9026200000|9026200000|90; ComponentLink1URL: https://datasheet.octopart.com:443/5525DSO-DB001DS-TE-Connectivity-datasheet-171856426.pdf?src-supplier=Farnell; ComponentLink1Description: https://datasheet.octopart.com:443/5525DSO-DB001DS-TE-Connectivity-datasheet-171856426.pdf?src-supplier=Farnell; ComponentLink2URL: https://datasheet.octopart.com:443/5525DSO-DB001DS-TE-Connectivity-datasheet-120162075.pdf?src-supplier=ODG+(Origin+Data+Global); ComponentLink2Description: https://datasheet.octopart.com:443/5525DSO-DB001DS-TE-Connectivity-datasheet-120162075.pdf?src-supplier=ODG+(Origin+Data+Global); ComponentLink3URL: https://datasheet.octopart.com:443/5525DSO-DB001DS-TE-Connectivity-datasheet-187716675.pdf?src-supplier=Master+Electronics; ComponentLink3Description: https://datasheet.octopart.com:443/5525DSO-DB001DS-TE-Connectivity-datasheet-187716675.pdf?src-supplier=Master+Electronics; ComponentLink4URL: https://datasheet.octopart.com:443/5525DSO-DB001DS-TE-Connectivity-datasheet-65793062.pdf?src-supplier=Future+Electronics; ComponentLink4Description: https://datasheet.octopart.com:443/5525DSO-DB001DS-TE-Connectivity-datasheet-65793062.pdf?src-supplier=Future+Electronics; ComponentLink5URL: https://datasheet.octopart.com:443/5525DSO-DB001DS-TE-Connectivity-datasheet-62043908.pdf?src-supplier=Future+Electronics; ComponentLink5Description: https://datasheet.octopart.com:443/5525DSO-DB001DS-TE-Connectivity-datasheet-62043908.pdf?src-supplier=Future+Electronics
footprint 5525DSO-DB001DS-2
pins: 1 SGND, 2 SOUT-, 3 SGND, 4 SOUT-, 5 SDO, 6 SDI/SDA, 7 SCLK/SCL, 8 CSB, 9 SUPPLY-, 10 PS, 11 SUPPLY+, 12 SOUT+, 13 SUPPLY+, 14 SOUT+, 15 GND, 16 SUPPLY, 17 SDA/MISO, 18 SCL/SCLK, 19 INT/SS

## 08051C103KAT2A
designator *
0805 10 nF 100V ±10 % Tolerance X7R Surface Mount Multilayer Ceramic Capacitor; Manufacturer: Kyocera AVX; Manufacturer Part Number: 08051C103KAT2A; Tolerance: 10%; Value: 10nF; Insulation Resistance: 100GR; Dissipation Factor: 2.5%; Supplier: Avnet; Supplier Part Number: 08051C103KAT2A; RoHS: Yes; Category: Ceramic Capacitors; Stock: 1644000; Pricing: 4000=0.03654, 8000=0.03570, 16000=0.03486, 24000=0.03402, 32000=0.03318, 40000=0.03234, 400000=0.03192 (USD); Mounting Technology: Surface Mount,PCB; Case/Package: 0805; Case Code (Metric): 2012; Case Code (Imperial): 0805; Contact Plating: Tin,Matte; Min Operating Temperature: -55°C; Max Operating Temperature: 125°C; Packaging: Tape and Reel; Voltage Rating (DC): 100V; Dielectric: X7R; Voltage: 100V; Package Quantity: 1; Voltage Rating: 100V; Termination: SMD/SMT; Series: -; Construction: Flat; Length: 2.01mm; Width: 0.008inch; Height: 0.94mm; Thickness: 0.037inch; Depth: 1.25mm; Size: 0.94mm; Radiation Hardening: No; Reach SVHC Compliant: Yes; Lead Free: Lead Free; RoHS Compliant: Yes; ComponentLink1URL: http://components.arrow.com/part/dataview/1120148S1579942N7710?src-supplier=Arrow+Electronics; ComponentLink1Description: http://components.arrow.com/part/dataview/1120148S1579942N7710?src-supplier=Arrow+Electronics

## 20279-001E-03
designator J?
1 POS Vertical SMD Coaxial connector M.2 industry standard with a mated height of 1.4 mm and support up to 12 GHz MHF 4L Receptacle; Manufacturer Part Number: 20279-001E-03
footprint IPEX_20279-001E-03
pins: 1 S, 2 GROUND, 3 GND

## 20498-026E-41
designator *
Connector Receptacle 32 POS 0.6mm SMD; Manufacturer: I-PEX; Manufacturer Part Number: 20498-026E-41; Supplier: CoreStaff; Supplier Part Number: ST64672480; RoHS: No; Category: LDO; Stock: 766; Pricing: 1=540, 10=274.5, 30=217.2, 50=205.74, 100=197.15, 300=191.42, 500=190.27, 1000=189.41 (JPY)
pins: 1, 2, 3, 4, 5, 6, 7, 8, 9, 10, 11, 12, 13, 14, 15, 16, 17, 18, 19, 20, 21, 22, 23, 24, 25, 26, G1 GND, G2 GND, P1 SHIELD, P2 SHIELD, P3 SHIELD, P4 SHIELD

## 35223R3JT
designator R?  value 3.3R  (hidden comment: *)
SMD Chip Resistor, 3.3 Ohm, ± 5%, 3 W, 2512 [6332 Metric], Thick Film, High Power; Manufacturer: TE Connectivity CGS; Manufacturer Part Number: 35223R3JT; Power Rating: 3W; Voltage Rating: 250V; Number of Resistors: 1; Temperature Coefficient: 200ppm/°C; Supplier: Digikey; Supplier Part Number: A121247CT-ND; RoHS: Yes; Category: Chip SMD Resistors; Stock: 22271; Pricing: 1=0.97, 10=0.576, 50=0.4242, 100=0.3769, 500=0.2941, 1000=0.26875 (USD); Mounting Technology: Surface Mount; Case/Package: 2512; Case Code (Metric): 6432; Case Code (Imperial): 2512; Min Operating Temperature: -55°C; Max Operating Temperature: 155°C; Termination: Solder; Packaging: Tape and Reel; Resistor Type: Thick Film,Power resistor; Tolerance: 5%; Number of Terminations: 2; Features: Automotive AEC-Q200; Series: 3522, CGS; Max Power Dissipation: 3W; Resistance Tolerance: 5%; Technology: THICK FILM; Voltage Rating (DC): 250V; Length: 6.35mm; Height: 1.1mm; Depth: 3.2mm; Ratings: AEC-Q200; RoHS Compliant: Yes; Reach SVHC Compliant: Unknown; ComponentLink1URL: http://uk.rs-online.com/webdocs/142d/0900766b8142d0df.pdf?src-supplier=Rs; ComponentLink1Description: http://uk.rs-online.com/webdocs/142d/0900766b8142d0df.pdf?src-supplier=Rs; ComponentLink2URL: http://www.farnell.com/datasheets/2007092.pdf?src-supplier=Farnell; ComponentLink2Description: http://www.farnell.com/datasheets/2007092.pdf?src-supplier=Farnell; ComponentLink3URL: http://datasheet.octopart.com/35223R3JT-TE-Connectivity-datasheet-62126963.pdf?src-supplier=Avnet; ComponentLink3Description: http://datasheet.octopart.com/35223R3JT-TE-Connectivity-datasheet-62126963.pdf?src-supplier=Avnet; ComponentLink4URL: https://datasheet.octopart.com/2176230-8-TE-Connectivity-datasheet-140469996.pdf?src-supplier=Future+Electronics; ComponentLink4Description: https://datasheet.octopart.com/2176230-8-TE-Connectivity-datasheet-140469996.pdf?src-supplier=Future+Electronics; ComponentLink5URL: http://www.farnell.com/datasheets/2007092.pdf?src-supplier=Element14; ComponentLink5Description: http://www.farnell.com/datasheets/2007092.pdf?src-supplier=Element14; ComponentLink6URL: http://datasheet.octopart.com/35223R3JT-TE-Connectivity-datasheet-62126963.pdf?src-supplier=Rs; ComponentLink6Description: http://datasheet.octopart.com/35223R3JT-TE-Connectivity-datasheet-62126963.pdf?src-supplier=Rs; ComponentLink7URL: http://datasheet.octopart.com/35223R3JT-TE-Connectivity-datasheet-62126963.pdf?src-supplier=Digikey; ComponentLink7Description: http://datasheet.octopart.com/35223R3JT-TE-Connectivity-datasheet-62126963.pdf?src-supplier=Digikey; ComponentLink8URL: https://www.te.com/commerce/DocumentDelivery/DDEController?Action=srchrtrv&DocNm=9-1773463-7&DocType=DS&DocLang=English&src-supplier=Digikey; ComponentLink8Description: https://www.te.com/commerce/DocumentDelivery/DDEController?Action=srchrtrv&DocNm=9-1773463-7&DocType=DS&DocLang=English&src-supplier=Digikey; ComponentLink9URL: https://datasheet.octopart.com/35223R3JT-TE-Connectivity-datasheet-136348520.pdf?src-supplier=Master+Electronics; ComponentLink9Description: https://datasheet.octopart.com/35223R3JT-TE-Connectivity-datasheet-136348520.pdf?src-supplier=Master+Electronics; ComponentLink10URL: http://datasheet.octopart.com/35223R3JT-TE-Connectivity-datasheet-62126963.pdf?src-supplier=Interstate+Connecting+Components; ComponentLink10Description: http://datasheet.octopart.com/35223R3JT-TE-Connectivity-datasheet-62126963.pdf?src-supplier=Interstate+Connecting+Components; ComponentLink11URL: http://datasheet.octopart.com/35223R3JT-TE-Connectivity-datasheet-62126963.pdf?src-supplier=TTI; ComponentLink11Description: http://datasheet.octopart.com/35223R3JT-TE-Connectivity-datasheet-62126963.pdf?src-supplier=TTI
footprint R 2512
pins: 1 B, 2 A

## 43025-0400
designator *
CONN RECEPT 4POS 3MM VERT DUAL; Manufacturer: Molex; Manufacturer Part Number: 43025-0400; Body Material: Polyester; Number of Circuits: 4; Gender: Female; Max Voltage Rating (AC): 600V; Max Voltage Rating (DC): 600.6kV; Contact Resistance: 10mR; Current Rating: 5A; Voltage Rating (AC): 250V; Connector Type: Power,Rectangular; Approvals: UL,CSA,TUV; Glow Wire Compliant: Non-compliant; Supplier: Mouser; Supplier Part Number: 538-43025-0400; RoHS: Yes; Category: Headers and Wire Housings; Stock: 268477; Pricing: 1=0.46, 10=0.386, 50=0.386, 100=0.301, 1000=0.236, 10000=0.214 (USD); Mounting Technology: Cable,Free Hanging; Contact Plating: Tin; Housing Color: Black; Housing Material: Polyester; Contact Material: Bronze; Color: Black; Material: Polyester; Min Operating Temperature: -40°C; Max Operating Temperature: 105°C; Packaging: Bulk; Number of Rows: 2; Package Quantity: 2500; Orientation: Straight; Series: Micro-Fit 3.0; Number of Poles: 4; Contact Gender: Female; Voltage Rating: 600V; Number of Positions: 4; Termination: Crimp; Number of Contacts: 4; Working Voltage: 250V; Length: 6.85mm; Width: 11.56mm; Pitch: 3mm; Depth: 14mm; RoHS Compliant: Yes; Reach SVHC Compliant: Unknown; Flammability Rating: UL94 V-0; Halogen Free: Low Halogen; Lead Free: Lead Free; ComponentLink1URL: https://datasheet.ciiva.com/14155/04402298-14155264.pdf?src-supplier=Distrelec; ComponentLink1Description: https://datasheet.ciiva.com/14155/04402298-14155264.pdf?src-supplier=Distrelec; ComponentLink2URL: https://datasheet.ciiva.com/11718/0900766b800c8543-11718004.pdf?src-supplier=Rs; ComponentLink2Description: https://datasheet.ciiva.com/11718/0900766b800c8543-11718004.pdf?src-supplier=Rs; ComponentLink3URL: https://datasheet.ciiva.com/5147/0430250400-crimp-housings-142746-5147449.pdf?src-supplier=Mouser; ComponentLink3Description: https://datasheet.ciiva.com/5147/0430250400-crimp-housings-142746-5147449.pdf?src-supplier=Mouser; ComponentLink4URL: https://datasheet.ciiva.com/16127/235170430250400-crimp-housings-16127681.pdf?src-supplier=Onlinecomponents.com; ComponentLink4Description: https://datasheet.ciiva.com/16127/235170430250400-crimp-housings-16127681.pdf?src-supplier=Onlinecomponents.com; ComponentLink5URL: https://datasheet.ciiva.com/30111/0430250400-crimp-housings-30111453.pdf?src-supplier=Onlinecomponents.com; ComponentLink5Description: https://datasheet.ciiva.com/30111/0430250400-crimp-housings-30111453.pdf?src-supplier=Onlinecomponents.com; ComponentLink6URL: https://datasheet.ciiva.com/19473/882883-19473820.pdf?src-supplier=Jameco; ComponentLink6Description: https://datasheet.ciiva.com/19473/882883-19473820.pdf?src-supplier=Jameco; ComponentLink7URL: https://datasheet.ciiva.com/10392/0430250400-crimp-housings-10392063.pdf?src-supplier=Avnet; ComponentLink7Description: https://datasheet.ciiva.com/10392/0430250400-crimp-housings-10392063.pdf?src-supplier=Avnet; ComponentLink8URL: https://datasheet.ciiva.com/18408/70190792-18408700.pdf?src-supplier=Allied+Electronics; ComponentLink8Description: https://datasheet.ciiva.com/18408/70190792-18408700.pdf?src-supplier=Allied+Electronics